# Altium footprint library Libraries_2014_0618.PcbLib: 391 footprints (part 1 of 25)
Each footprint in its own frame and in the unit in brackets; x right, y up, seen from the top. Pads: shape width x height; smd on the part's side, far side on the other; paste and mask are expansions set on the pad; w line width, h text height; cw(c..) or ccw(c..) is an arc to the next point about the centre after c.
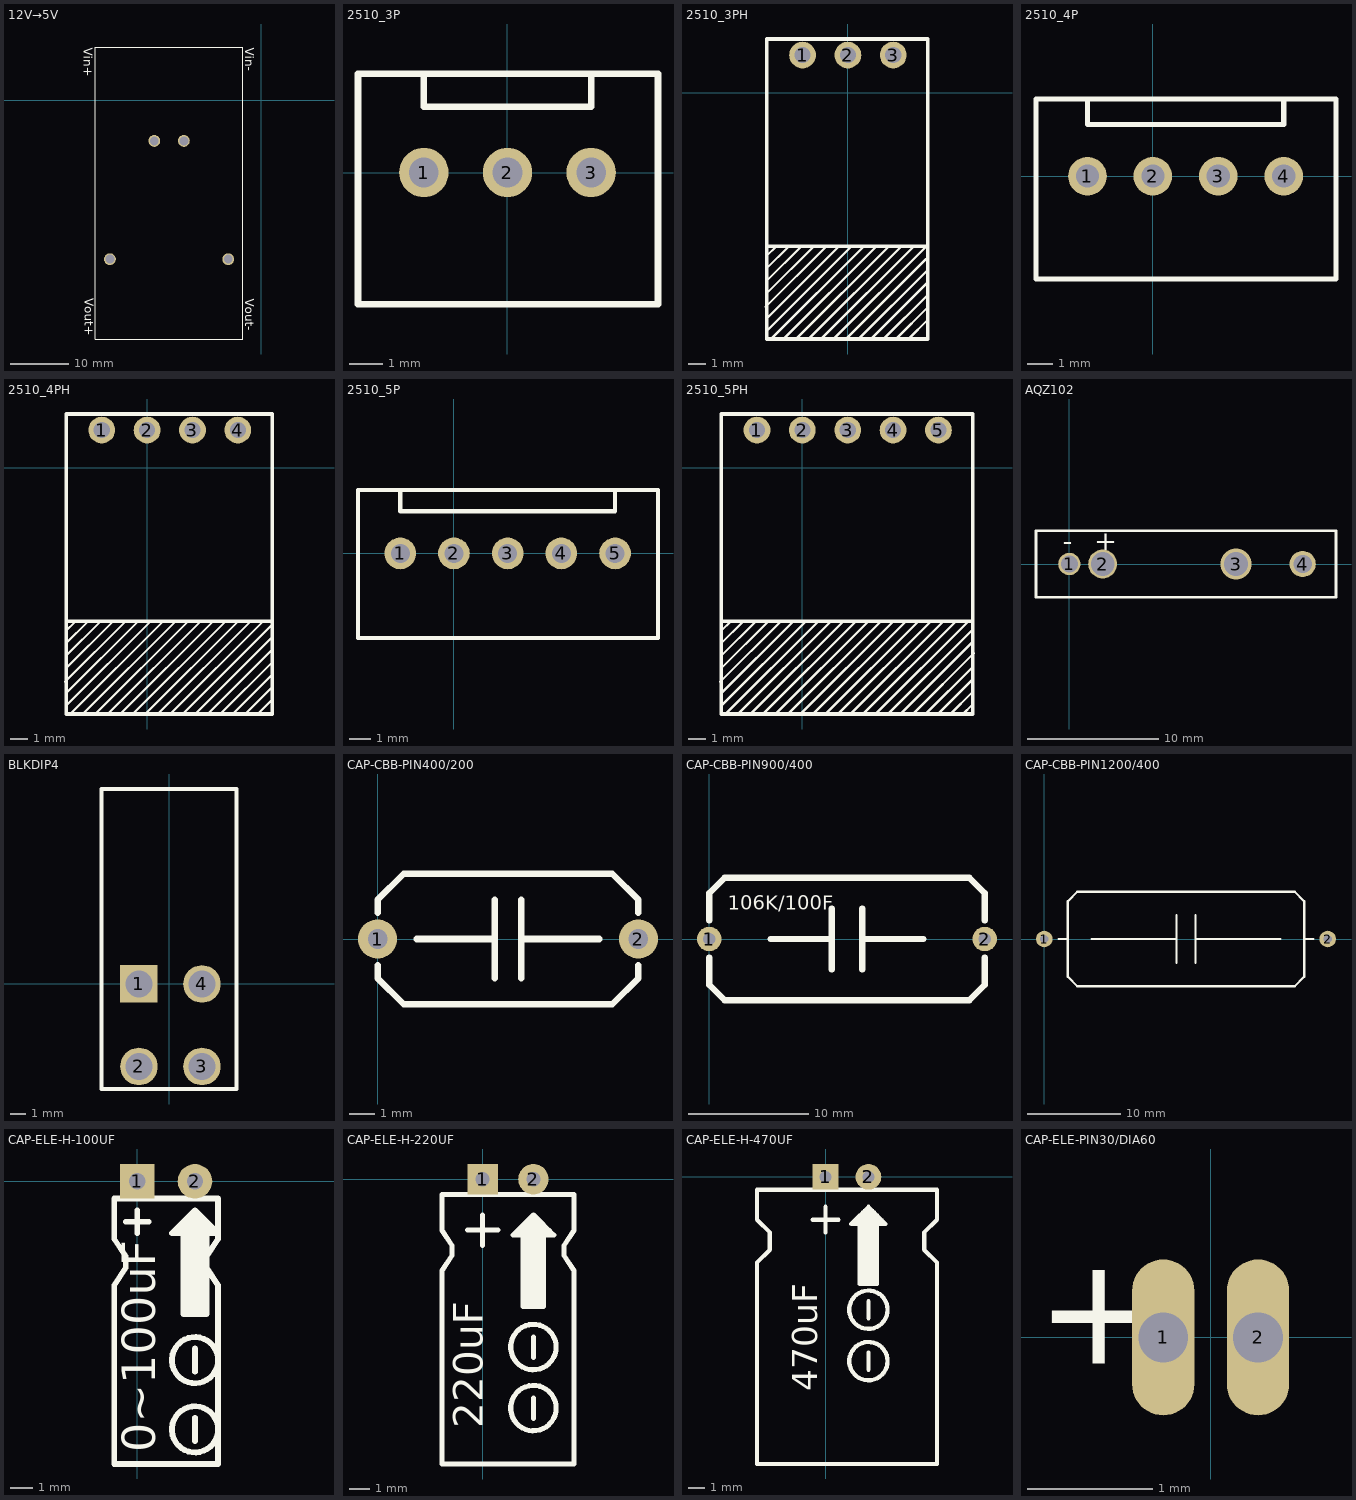
[diagram p0: the footprints below, top view; thin cyan lines are the x and y axes]

## 12V→5V [mil]
pads (4):
  round 80 hole 60: Vin+(-725,-275) Vin-(-525,-275) Vout+(-1025,-1075) Vout-(-225,-1075)
Top Overlay:
  lines w0.1: -1125,-1615 -125,-1615 -125,360 -1125,360 -1125,-1615
  text "Vin+" at -1200.79,354.33 h60
  text "Vin-" at -110.24,354.33 h60
  text "Vout-" at -110.24,-1342.52 h60
  text "Vout+" at -1196.85,-1338.58 h60

## 2510_3P [mm] "白色线座（我们用的真的是白色的！）"
pads (3):
  round 1.5 hole 0.9: 1(-2.54,0) 2(0,0) 3(2.54,0)
Top Overlay:
  lines w0.2: 2.54,3 2.54,2 -2.54,2 -2.54,3 ; -2.54,3 -4.54,3 -4.54,-4 4.572,-4 4.572,3 -2.54,3

## 2510_3PH [mm] "白色线座（我们用的是白色的！）"
pads (3):
  round 1.5 hole 0.9: 1(-2.54,2.1) 2(0,2.1) 3(2.54,2.1)
Top Overlay:
  lines w0.127: -4.6,-12 -1.2,-8.6 ; -4.57,-10.57 -2.6,-8.6 ; -4.57,-9.87 -3.3,-8.6 ; -4.57,-9.17 -4,-8.6 ; -4.55,-13.35 0.2,-8.6 ; -4.55,-12.65 -0.5,-8.6 ; -4.54,-11.7 -4.54,-11.24 -1.9,-8.6 ; -4.3,-13.8 0.9,-8.6 ; -3.6,-13.8 1.6,-8.6 ; -2.9,-13.8 2.3,-8.6 ; -2.2,-13.8 3,-8.6 ; -0.8,-13.8 4.4,-8.6 ; -0.1,-13.8 4.38,-9.32 ; 0.6,-13.8 4.4,-10 ; 1.3,-13.8 4.43,-10.67 ; 2,-13.8 4.48,-11.32 ; 2.7,-13.8 4.5,-12 ; 3.4,-13.8 4.5,-12.7 ; -1.5,-13.8 3.7,-8.6 -1.5,-13.8
  lines w0.2: -4.54,-13.8 -4.54,-8.5 ; -4.5,-13.8 4.46,-13.8 ; 4.46,-13.74 4.46,-8.6 ; 4.46,-8.6 4.46,-4 4.46,3 -2.54,3 -4.54,3 -4.54,-4 -4.54,-8.6 4.46,-8.6

## 2510_4P [mm] "白色线座"
pads (4):
  round 1.5 hole 0.9: 1(-2.54,0) 2(0,0) 3(2.54,0) 4(5.08,0)
Top Overlay:
  lines w0.2: 5.08,3 5.08,2 -2.54,2 -2.54,3 ; -2.54,3 7.112,3 7.112,-4 -4.54,-4 -4.54,3 -2.54,3

## 2510_4PH [mm] "白色线座（我们用的是白色的！）"
pads (4):
  round 1.5 hole 0.9: 1(-2.54,2.1) 2(0,2.1) 3(2.54,2.1) 4(5.08,2.1)
Top Overlay:
  lines w0.127: -4.6,-12 -1.2,-8.6 ; -4.57,-10.57 -2.6,-8.6 ; -4.57,-9.87 -3.3,-8.6 ; -4.57,-9.17 -4,-8.6 ; -4.55,-13.35 0.2,-8.6 ; -4.55,-12.65 -0.5,-8.6 ; -4.54,-11.7 -4.54,-11.24 -1.9,-8.6 ; -4.3,-13.8 0.9,-8.6 ; -3.6,-13.8 1.6,-8.6 ; -2.9,-13.8 2.3,-8.6 ; -2.2,-13.8 3,-8.6 ; -0.8,-13.8 4.4,-8.6 ; -0.1,-13.8 5.1,-8.6 ; 0.6,-13.8 5.8,-8.6 ; 1.3,-13.8 6.5,-8.6 ; 2,-13.8 7,-8.8 ; 2.7,-13.8 6.95,-9.55 ; 3.4,-13.8 6.95,-10.25 ; 4.1,-13.8 7,-10.9 ; 4.8,-13.8 7.05,-11.55 ; 5.5,-13.8 6.95,-12.35 ; 6.2,-13.8 7.05,-12.95 ; -1.5,-13.8 3.7,-8.6 -1.5,-13.8
  lines w0.2: -4.54,-13.8 -4.54,-8.5 ; -4.5,-13.8 7,-13.8 ; 7,-13.74 7,-8.6 ; 7,-8.6 -4.54,-8.6 -4.54,-4 -4.54,3 -2.54,3 7,3 7,-4 7,-8.6

## 2510_5P [mm] "白色线座"
pads (5):
  round 1.5 hole 0.9: 1(-2.54,0) 2(0,0) 3(2.54,0) 4(5.08,0) 5(7.62,0)
Top Overlay:
  lines w0.2: 7.62,3 7.62,2 -2.54,2 -2.54,3 ; -2.54,3 9.652,3 9.652,-4 -4.54,-4 -4.54,3 -2.54,3

## 2510_5PH [mm] "白色线座（我们用的是白色的！）"
pads (5):
  round 1.5 hole 0.9: 1(-2.54,2.1) 2(0,2.1) 3(2.54,2.1) 4(5.08,2.1) 5(7.62,2.1)
Top Overlay:
  lines w0.127: -4.6,-12 -1.2,-8.6 ; -4.57,-10.57 -2.6,-8.6 ; -4.57,-9.87 -3.3,-8.6 ; -4.57,-9.17 -4,-8.6 ; -4.55,-13.35 0.2,-8.6 ; -4.55,-12.65 -0.5,-8.6 ; -4.54,-11.7 -4.54,-11.24 -1.9,-8.6 ; -4.3,-13.8 0.9,-8.6 ; -3.6,-13.8 1.6,-8.6 ; -2.9,-13.8 2.3,-8.6 ; -2.2,-13.8 3,-8.6 ; -0.8,-13.8 4.4,-8.6 ; -0.1,-13.8 5.1,-8.6 ; 0.6,-13.8 5.8,-8.6 ; 1.3,-13.8 6.5,-8.6 ; 2,-13.8 7.2,-8.6 ; 2.7,-13.8 7.9,-8.6 ; 3.4,-13.8 8.6,-8.6 ; 4.1,-13.8 9.3,-8.6 ; 4.8,-13.8 9.55,-9.05 ; 5.5,-13.8 9.5,-9.8 ; 6.2,-13.8 9.6,-10.4 ; 6.9,-13.8 9.55,-11.15 ; 7.6,-13.8 9.47,-11.93 ; 8.3,-13.8 9.52,-12.58 ; 9,-13.8 9.52,-13.28 ; -1.5,-13.8 3.7,-8.6 -1.5,-13.8
  lines w0.2: -4.54,-13.8 -4.54,-8.5 ; -4.5,-13.8 9.54,-13.8 ; 9.54,-13.74 9.54,-8.6 ; 9.54,-8.6 -4.54,-8.6 -4.54,-4 -4.54,3 -2.54,3 9.54,3 9.54,-4 9.54,-8.6

## AQZ102 [mm]
pads (4):
  round 1.7 hole 1.3: 1(0,0)
  round 2.2 hole 1.8: 2(2.54,0)
  round 2.4 hole 1.8: 3(12.7,0)
  round 2 hole 1.4: 4(17.78,0)
Top Overlay:
  lines w0.2: -2.54,-2.54 -2.54,2.54 20.32,2.54 20.32,-2.54 -2.54,-2.54
  text "+" at 1.9,1 h1.52
  text "-" at -0.5,1 h1.52

## BLKDIP4 [mm]
pads (4):
  rect 2.5x2.5 hole 1.8: 1(-2,0)
  round 2.5 hole 1.8: 2(-2,-5.5) 3(2.2,-5.5) 4(2.2,0)
Top Overlay:
  lines w0.254: -4.5,-7 4.5,-7 4.5,8.5 4.5,13 -4.5,13 -4.5,9.5 -4.5,-7

## CAP-CBB-PIN400/200 [mil]
pads (2):
  round 60 hole 30: 1(0,0) 2(400,0)
Top Overlay:
  lines w10: 0,-40 0,-60 40,-100 360,-100 400,-60 400,-40 ; 0,40 0,60 40,100 360,100 400,60 400,40 ; 60,0 180,0 ; 180,-60 180,60 ; 220,-60 220,60 ; 220,0 340,0

## CAP-CBB-PIN900/400 [mil]
height 700
pads (2):
  round 80 hole 40: 1(0,0) 2(900,0)
Top Overlay:
  lines w20: 0,-60 0,-150 50,-200 850,-200 900,-150 900,-60 ; 0,60 0,150 50,200 850,200 900,150 900,60 ; 200,0 400,0 ; 400,-100 400,100 ; 500,-100 500,100 ; 500,0 700,0
  text "106K/100F" at 60,80 h80

## CAP-CBB-PIN1200/400 [mil]
pads (2):
  round 70 hole 35: 1(0,0) 2(1200,0)
Top Overlay:
  lines w10: 60,0 100,0 ; 200,0 560,0 ; 560,-100 560,100 ; 640,-100 640,100 ; 640,0 1000,0 ; 1100,0 1140,0 ; 100,-160 100,140 100,160 140,200 1060,200 1100,160 1100,-140 1100,-160 1060,-200 140,-200 100,-160

## CAP-ELE-H-100UF [mil]
pads (2):
  rect 60x60 hole 28: 1(0,0)
  round 60 hole 28: 2(100,0)
Top Overlay:
  circle w10: c100,-430 r40
  circle w10: c100,-310 r40.01
  rectangle: 80,-230 120,-69
  rectangle: 91.16,-77 110,-58.84
  rectangle: 93.85,-69 106,-56.15
  rectangle: 77.32,-90 82,-72.68
  rectangle: 74.31,-90 78,-75.69
  rectangle: 71.24,-90 75,-78.76
  rectangle: 68.45,-90 72.83,-81.39
  rectangle: 65.75,-90 69.83,-84.08
  rectangle: 88.09,-69 93.85,-61.91
  rectangle: 85.46,-69 88.09,-64.54
  rectangle: 83.81,-69 85.62,-66.36
  rectangle: 117.83,-90 125.35,-75.51
  rectangle: 125,-90 131.15,-81.15
  rectangle: 129.83,-90 139.83,-84
  rectangle: 125,-81.15 128.08,-78.08
  rectangle: 117.83,-75.51 123.03,-73.2
  rectangle: 106,-69 113.74,-63.74
  rectangle: 113.57,-69 116.64,-66.81
  lines w10: -20,-70 20,-70 ; 0,-90 0,-50 ; 80,-90 80,-230 120,-230 120,-90 ; 100,-450 100,-410 ; 100,-330 100,-290 ; 100,-63 100,-50 ; 100,-50 60,-90 140,-90 100,-50 ; -40,-490 -40,-180 -20,-150 -20,-130 -40,-100 -40,-30 140,-30 140,-100 120,-130 120,-150 140,-180 140,-490 -40,-490
  text "0~100uF" at 50,-470 h100

## CAP-ELE-H-220UF [mil]
pads (2):
  rect 60x60 hole 28: 1(0,0)
  round 60 hole 28: 2(100,0)
Top Overlay:
  circle w10: c100,-330 r44.72
  circle w10: c100,-450 r44.72
  rectangle: 80,-240 120,-110
  rectangle: 80,-250 120,-210
  lines w10: -30,-100 30,-100 ; 0,-130 0,-70 ; 71.81,-99.88 80,-108.06 80,-110 80,-250 110,-250 120,-250 120,-110 ; 78.15,-101.15 131.15,-101.15 ; 79.21,-94.61 124.61,-94.61 ; 80.87,-89.13 119.13,-89.13 ; 85.93,-84.07 114.07,-84.07 ; 91.2,-78.8 108.8,-78.8 ; 100,-470 100,-430 ; 100,-350 100,-310 ; -80,-560 180,-560 180,-180 160,-150 160,-130 180,-100 180,-30 -80,-30 -80,-100 -60,-130 -60,-150 -80,-180 -80,-560 ; 60,-110 70,-110 140,-110 100,-70 60,-110
  text "220uF" at 20,-490 h100

## CAP-ELE-H-470UF [mil]
pads (2):
  rect 60x60 hole 28: 1(0,0)
  round 60 hole 28: 2(100,0)
Top Overlay:
  circle w10: c100,-310 r44.72
  circle w10: c100,-430 r44.72
  rectangle: 80,-240 120,-110
  rectangle: 80,-250 120,-210
  lines w10: -30,-100 30,-100 ; 0,-130 0,-70 ; 71.81,-99.88 80,-108.06 80,-110 80,-250 110,-250 120,-250 120,-110 ; 78.15,-101.15 131.15,-101.15 ; 79.21,-94.61 124.61,-94.61 ; 80.87,-89.13 119.13,-89.13 ; 85.93,-84.07 114.07,-84.07 ; 91.2,-78.8 108.8,-78.8 ; 100,-450 100,-410 ; 100,-330 100,-290 ; -160,-670 260,-670 260,-200 230,-170 230,-130 260,-100 260,-30 -160,-30 -160,-100 -130,-130 -130,-170 -160,-200 -160,-670 ; 60,-110 70,-110 140,-110 100,-70 60,-110
  text "470uF" at 0,-500 h100

## CAP-ELE-PIN30/DIA60 [mm] "Capacitor, Radial, Tantalum; Body 1.45 x 2.54 mm (Dia.xH max); Pin Spacing 0.76 mm (typ)"
height 2.54
pads (2):
  oval 0.5x1.25 hole 0.4: 1(-0.38,0) 2(0.38,0)
Top Overlay:
  text "+" at -1.4,-0.5 h1.5